# Altium footprint library Ixora.PcbLib: 191 footprints (part 5 of 12)
Each footprint in its own frame and in the unit in brackets; x right, y up, seen from the top. Pads: shape width x height; smd on the part's side, far side on the other; paste and mask are expansions set on the pad; w line width, h text height; cw(c..) or ccw(c..) is an arc to the next point about the centre after c.
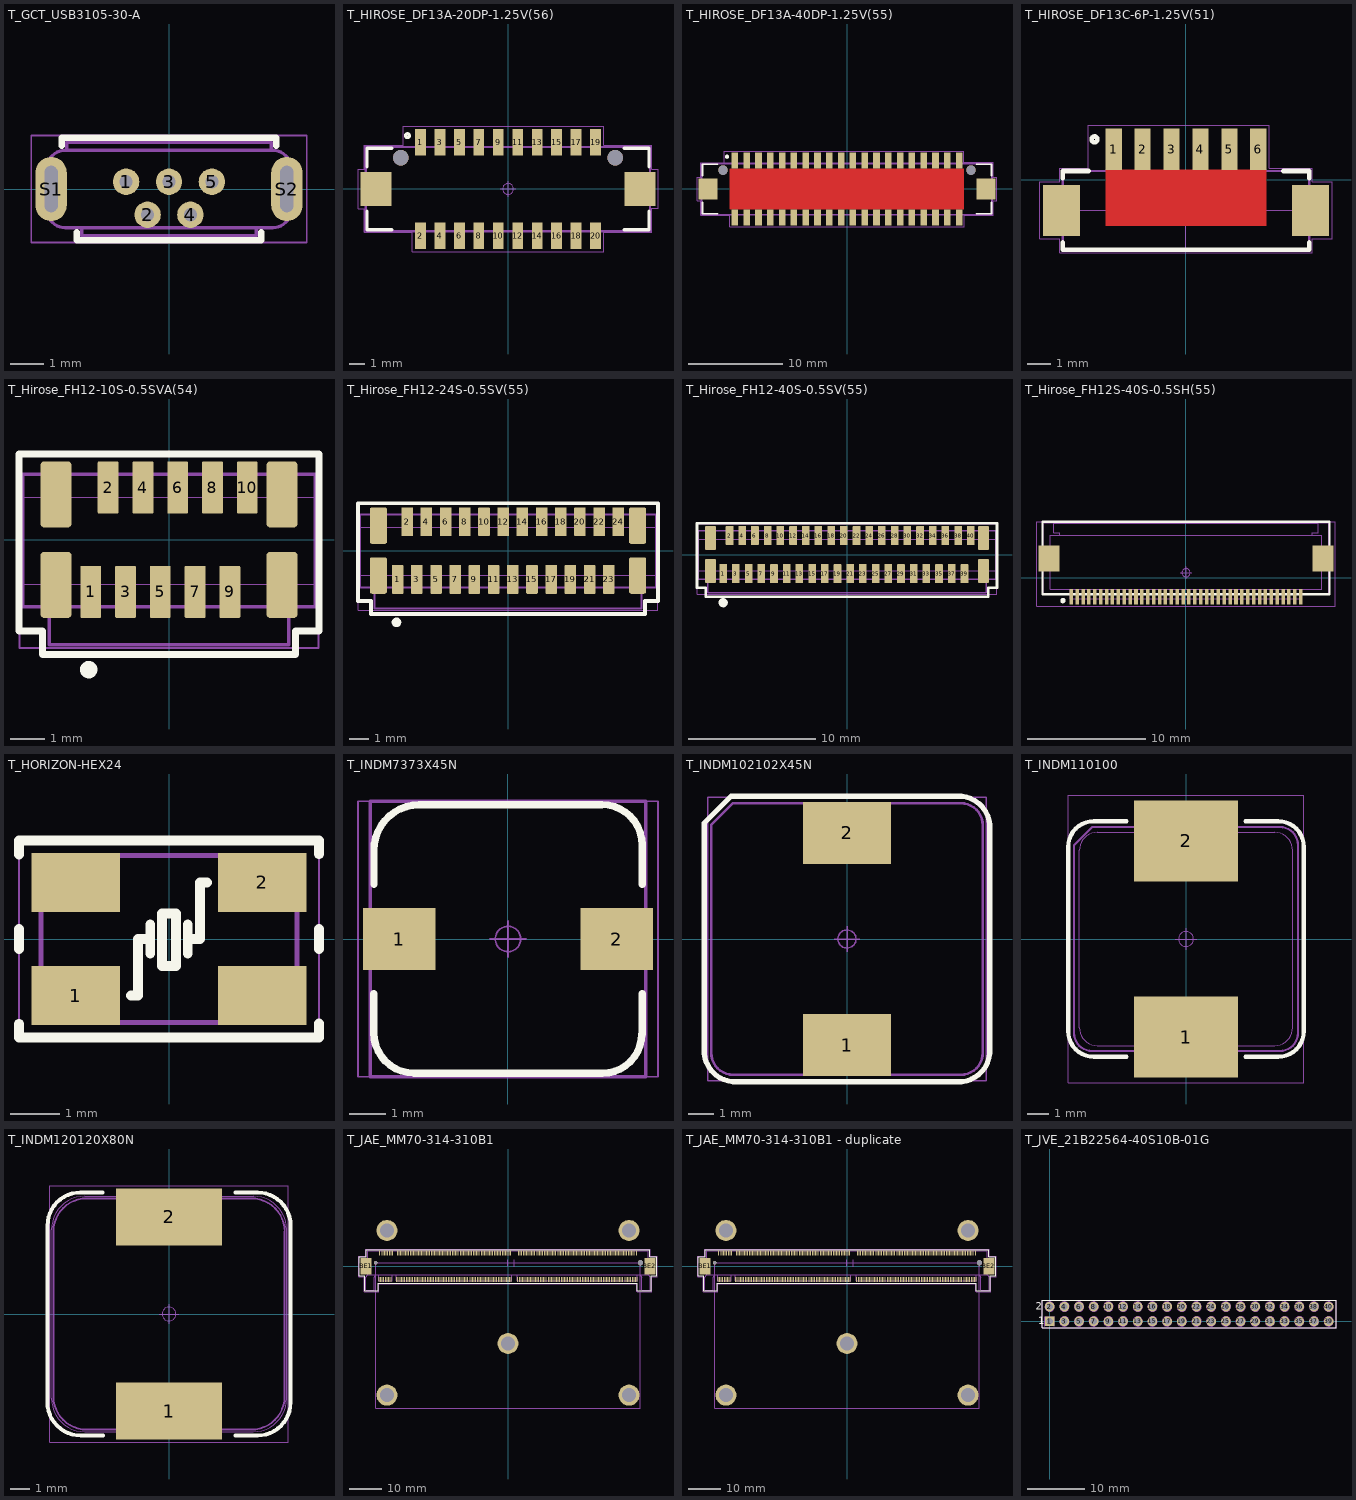
[diagram p4: the footprints below, top view; thin cyan lines are the x and y axes]

## T_GCT_USB3105-30-A [mm] "Micro USB Connector Vertical"
height 5.6
pads (7):
  round 0.8 hole 0.4: 1(-1.3,0.22) 2(-0.65,-0.78) 3(0,0.22) 4(0.65,-0.78) 5(1.3,0.22)
  oval 0.95x1.95 hole 0.4 slot 1.4 at 90 deg: S1(-3.575,0) S2(3.575,0)
Top Overlay:
  lines w0.2: -3.25,1.32 -3.25,1.55 3.25,1.55 3.25,1.32 ; -2.8,-1.32 -2.8,-1.55 2.8,-1.55 2.8,-1.32
Mechanical 1:
  lines w0.05: -4.175,-1.625 -4.175,1.625 4.175,1.625 4.175,-1.625 -4.175,-1.625
Mechanical 2:
  lines w0.001: -3.7,-0.175 -3.945,-0.175 -3.945,0.625 -3.7,0.625 ; -3.1,1.175 -3.1,1.42 3.1,1.42 3.1,1.175 ; -2.65,-1.175 -2.65,-1.42 2.65,-1.42 2.65,-1.175 ; 3.15,1.175 cw(c3.15,0.625) 3.7,0.625 ; 3.175,1.175 -3.15,1.175 ccw(c-3.15,0.625) -3.7,0.625 ; 3.7,-0.175 3.945,-0.175 3.945,0.625 3.7,0.625 ; -3.7,0.625 -3.7,-0.625 ccw(c-3.15,-0.625) -3.15,-1.175 3.15,-1.175 ccw(c3.15,-0.625) 3.7,-0.625 3.7,0.625
Mechanical 3:
  lines w0.1: -3.7,-0.175 -3.945,-0.175 -3.945,0.625 -3.7,0.625 ; -3.1,1.175 -3.1,1.42 3.1,1.42 3.1,1.175 ; -2.65,-1.175 -2.65,-1.42 2.65,-1.42 2.65,-1.175 ; 3.15,1.175 cw(c3.15,0.625) 3.7,0.625 ; 3.175,1.175 -3.15,1.175 ccw(c-3.15,0.625) -3.7,0.625 ; 3.7,-0.175 3.945,-0.175 3.945,0.625 3.7,0.625 ; -3.7,0.625 -3.7,-0.625 ccw(c-3.15,-0.625) -3.15,-1.175 3.15,-1.175 ccw(c3.15,-0.625) 3.7,-0.625 3.7,0.625
3D body: height 5.62, standoff -1.48, extent -3.98,-1.455 3.98,1.48

## T_HIROSE_DF13A-20DP-1.25V(56) [mm]
height 4.8
pads (24):
  rect 0.7x1.7 smd: 1(-5.625,3) 2(-5.625,-3) 3(-4.375,3) 4(-4.375,-3) 5(-3.125,3) 6(-3.125,-3) 7(-1.875,3) 8(-1.875,-3) 9(-0.625,3) 10(-0.625,-3) 11(0.625,3) 12(0.625,-3) 13(1.875,3) 14(1.875,-3) 15(3.125,3) 16(3.125,-3) 17(4.375,3) 18(4.375,-3) 19(5.625,3) 20(5.625,-3)
  rect 2x2.2 smd: ""(-8.475,0) ""(8.475,0)
  round 1 hole 1 unplated paste+0 mask+0: ""(-6.875,2) ""(6.875,2)
Top Overlay:
  circle w0.2: c-6.455,3.42 r0.125
  lines w0.2: -9.04,-1.42 -9.04,-2.62 -7.463,-2.62 ; -9.04,1.41 -9.04,2.61 -7.463,2.61 ; 7.463,-2.62 9.04,-2.62 9.04,-1.42 ; 7.463,2.61 9.04,2.61 9.04,1.41
Mechanical 1:
  circle w0.05: c0,0 r0.35
  lines w0.05: -0.5,0 0.5,0 ; 0,-0.5 0,0.5 ; 9.222,1.255 9.222,2.804 8.052,2.804 6.136,2.804 6.136,4.01 -6.726,4.01 -6.726,2.796 -9.216,2.796 -9.216,1.652 -9.216,1.252 -9.63,1.252 -9.63,-1.258 -9.218,-1.258 -9.218,-2.796 -6.142,-2.796 -6.142,-4.02 6.143,-4.02 6.143,-2.796 9.221,-2.796 9.221,-1.248 9.63,-1.248 ; 9.224,1.255 9.63,1.255 9.63,-1.237
Mechanical 2:
  lines w0.001: -9.175,-2.75 9.175,-2.75 9.175,2.75 -9.175,2.75 -9.175,-2.75
Mechanical 3:
  lines w0.1: -9.1,-2.68 9.1,-2.68 9.1,2.67 -9.1,2.67 -9.1,-2.68
3D body: height 4.8, standoff 0, extent -9.175,-3.45 9.175,3.45

## T_HIROSE_DF13A-40DP-1.25V(55) [mm]
height 4.8
pads (44):
  rect 0.7x1.7 smd: 1(-11.875,3) 2(-11.875,-3) 3(-10.625,3) 4(-10.625,-3) 5(-9.375,3) 6(-9.375,-3) 7(-8.125,3) 8(-8.125,-3) 9(-6.875,3) 10(-6.875,-3) 11(-5.625,3) 12(-5.625,-3) 13(-4.375,3) 14(-4.375,-3) 15(-3.125,3) 16(-3.125,-3) 17(-1.875,3) 18(-1.875,-3) 19(-0.625,3) 20(-0.625,-3) 21(0.625,3) 22(0.625,-3) 23(1.875,3) 24(1.875,-3) 25(3.125,3) 26(3.125,-3) 27(4.375,3) 28(4.375,-3) 29(5.625,3) 30(5.625,-3) 31(6.875,3) 32(6.875,-3) 33(8.125,3) 34(8.125,-3) 35(9.375,3) 36(9.375,-3) 37(10.625,3) 38(10.625,-3) 39(11.875,3) 40(11.875,-3)
  rect 2x2.2 smd: ""(-14.725,0) ""(14.725,0)
  round 1 hole 1 unplated paste+0 mask+0: ""(-13.125,2) ""(13.125,2)
Top Layer:
  pour cut-out: -12.4,-2.15 12.375,-2.15 12.375,2.15 -12.4,2.15
Top Overlay:
  circle w0.2: c-12.705,3.42 r0.125
  lines w0.2: -15.29,-1.42 -15.29,-2.62 -13.713,-2.62 ; -15.29,1.41 -15.29,2.61 -13.713,2.61 ; 13.713,-2.62 15.29,-2.62 15.29,-1.42 ; 13.713,2.61 15.29,2.61 15.29,1.41
Mechanical 1:
  circle w0.05: c0,0 r0.35
  lines w0.05: -0.5,0 0.5,0 ; 0,-0.5 0,0.5 ; 15.472,1.255 15.472,2.804 14.302,2.804 12.386,2.804 12.386,4.01 -12.976,4.01 -12.976,2.796 -15.466,2.796 -15.466,1.652 -15.466,1.252 -15.88,1.252 -15.88,-1.258 -15.468,-1.258 -15.468,-2.796 -12.392,-2.796 -12.392,-4.02 12.393,-4.02 12.393,-2.796 15.471,-2.796 15.471,-1.248 15.88,-1.248 ; 15.474,1.255 15.88,1.255 15.88,-1.237
Mechanical 2:
  lines w0.001: -15.425,-2.75 15.425,-2.75 15.425,2.75 -15.425,2.75 -15.425,-2.75
Mechanical 3:
  lines w0.1: -15.35,-2.68 15.35,-2.68 15.35,2.67 -15.35,2.67 -15.35,-2.68
3D body: height 4.82, standoff 0.02, extent -15.425,-3.45 15.425,3.45

## T_HIROSE_DF13C-6P-1.25V(51) [mm] "Touch connector"
height 4.8
pads (8):
  rect 0.7x1.8 smd: 1(-3.125,1.325) 2(-1.875,1.325) 3(-0.625,1.325) 4(0.625,1.325) 5(1.875,1.325) 6(3.125,1.325)
  rect 1.6x2.2 smd: ""(-5.385,-1.324) ""(5.385,-1.324)
Top Layer:
  pour cut-out: -3.475,0.425 -3.475,-1.994 3.475,-1.994 3.475,0.425
Top Overlay:
  circle w0.2: c-3.955,1.745 r0.125
  lines w0.2: -5.325,-2.713 -5.325,-3.024 5.325,-3.024 5.325,-2.713 ; -5.325,0.064 -5.325,0.376 -4.201,0.376 ; 4.201,0.376 5.325,0.376 5.325,0.064
Mechanical 1:
  lines w0.05: -6.316,-2.555 -6.316,-0.093 -5.456,-0.093 -5.456,0.506 -4.226,0.506 -4.226,2.354 3.606,2.354 3.606,0.507 5.456,0.507 5.456,-0.092 6.316,-0.093 6.316,-2.555 5.456,-2.555 5.456,-3.155 -5.456,-3.155 -5.456,-2.555 -6.316,-2.555
Mechanical 2:
  region: -5.991,-1.074 -5.45,-1.074 -5.45,-1.575 -5.991,-1.575
  lines w0.001: -5.325,-2.224 -6.075,-2.224 -6.075,-0.424 -5.325,-0.424 ; -5.325,-1.324 5.325,-1.324 ; 0,-3.024 0,0.376 ; 5.325,-2.224 6.075,-2.224 6.075,-0.424 5.325,-0.424 ; -5.325,-3.024 -5.325,0.376 5.325,0.376 5.325,-3.024 -5.325,-3.024
Mechanical 3:
  lines w0.1: -5.325,-3.024 -5.325,0.376 5.325,0.376 5.325,-3.024 -5.325,-3.024
3D body: height 4.82, standoff 0.02, extent -6.075,-3.025 6.075,1.875

## T_Hirose_FH12-10S-0.5SVA(54) [mm] "FFC Connector 0.5mm pitch Vertical, 10 pin"
height 5.5
pads (14):
  rrect12% 0.6x1.5 smd: 1(-2.25,-1.5) 2(-1.75,1.5) 3(-1.25,-1.5) 4(-0.75,1.5) 5(-0.25,-1.5) 6(0.25,1.5) 7(0.75,-1.5) 8(1.25,1.5) 9(1.75,-1.5) 10(2.25,1.5)
  rrect25% 0.9x1.9 smd: ""(-3.25,-1.3) ""(-3.25,1.3) ""(3.25,-1.3) ""(3.25,1.3)
Top Overlay:
  circle w0.25: c-2.31,-3.738 r0.125
  lines w0.2: -4.314,-2.625 -3.632,-2.625 -3.632,-3.307 3.632,-3.307 3.632,-2.625 4.314,-2.625 4.314,2.464 -4.314,2.464 -4.314,-2.625
Mechanical 1:
  lines w0.05: -4.3,-3.116 -4.3,2.416 4.3,2.416 4.3,-3.116 -4.3,-3.116
Mechanical 2:
  lines w0.001: -4.2,-1.275 4.2,-1.275 ; -4.2,1.225 4.2,1.225 ; -3.45,-1.925 -3.45,-3.025 3.45,-3.025 3.45,-1.925 ; -4.2,-1.925 -4.2,1.875 4.2,1.875 4.2,-1.925 -4.2,-1.925
Mechanical 3:
  lines w0.1: -3.45,-1.925 -3.45,-3.025 3.45,-3.025 3.45,-1.925 ; -4.2,-1.925 -4.2,1.875 4.2,1.875 4.2,-1.925 -4.2,-1.925
3D body: height 4.85, standoff -0.65, extent -4.2,-1.925 4.2,1.875

## T_Hirose_FH12-24S-0.5SV(55) [mm] "FFC Connector 0.5mm pitch Vertical"
height 5.5
pads (28):
  rrect12% 0.6x1.5 smd: 1(-5.75,-1.5) 2(-5.25,1.5) 3(-4.75,-1.5) 4(-4.25,1.5) 5(-3.75,-1.5) 6(-3.25,1.5) 7(-2.75,-1.5) 8(-2.25,1.5) 9(-1.75,-1.5) 10(-1.25,1.5) 11(-0.75,-1.5) 12(-0.25,1.5) 13(0.25,-1.5) 14(0.75,1.5) 15(1.25,-1.5) 16(1.75,1.5) 17(2.25,-1.5) 18(2.75,1.5) 19(3.25,-1.5) 20(3.75,1.5) 21(4.25,-1.5) 22(4.75,1.5) 23(5.25,-1.5) 24(5.75,1.5)
  rrect25% 0.9x1.9 smd: ""(-6.75,-1.3) ""(-6.75,1.3) ""(6.75,-1.3) ""(6.75,1.3)
Top Overlay:
  circle w0.25: c-5.81,-3.738 r0.125
  lines w0.2: -7.814,-2.625 -7.814,2.464 7.814,2.464 7.814,-2.625 7.132,-2.625 7.132,-3.307 -7.132,-3.307 -7.132,-2.625 -7.814,-2.625
Mechanical 1:
  lines w0.05: -7.8,-3.116 7.8,-3.116 7.8,2.416 -7.8,2.416 -7.8,-3.116
Mechanical 2:
  lines w0.001: -7.7,-1.275 7.7,-1.275 ; -7.7,1.225 7.7,1.225 ; -6.95,-1.925 -6.95,-3.025 6.95,-3.025 6.95,-1.925 ; -7.7,-1.925 7.7,-1.925 7.7,1.875 -7.7,1.875 -7.7,-1.925
Mechanical 3:
  lines w0.1: -6.95,-1.925 -6.95,-3.025 6.95,-3.025 6.95,-1.925 ; -7.7,-1.925 7.7,-1.925 7.7,1.875 -7.7,1.875 -7.7,-1.925
3D body: height 5.52, standoff 0.02, extent -7.7,-1.925 7.7,1.875

## T_Hirose_FH12-40S-0.5SV(55) [mm] "FFC Connector 0.5mm pitch Vertical"
height 5.5
pads (44):
  rrect12% 0.6x1.5 smd: 1(-9.75,-1.5) 2(-9.25,1.5) 3(-8.75,-1.5) 4(-8.25,1.5) 5(-7.75,-1.5) 6(-7.25,1.5) 7(-6.75,-1.5) 8(-6.25,1.5) 9(-5.75,-1.5) 10(-5.25,1.5) 11(-4.75,-1.5) 12(-4.25,1.5) 13(-3.75,-1.5) 14(-3.25,1.5) 15(-2.75,-1.5) 16(-2.25,1.5) 17(-1.75,-1.5) 18(-1.25,1.5) 19(-0.75,-1.5) 20(-0.25,1.5) 21(0.25,-1.5) 22(0.75,1.5) 23(1.25,-1.5) 24(1.75,1.5) 25(2.25,-1.5) 26(2.75,1.5) 27(3.25,-1.5) 28(3.75,1.5) 29(4.25,-1.5) 30(4.75,1.5) 31(5.25,-1.5) 32(5.75,1.5) 33(6.25,-1.5) 34(6.75,1.5) 35(7.25,-1.5) 36(7.75,1.5) 37(8.25,-1.5) 38(8.75,1.5) 39(9.25,-1.5) 40(9.75,1.5)
  rrect25% 0.9x1.9 smd: ""(-10.75,-1.3) ""(-10.75,1.3) ""(10.75,-1.3) ""(10.75,1.3)
Top Overlay:
  circle w0.4: c-9.75,-3.79 r0.16
  lines w0.2: 11.13,-3.307 -11.132,-3.307 -11.132,-2.625 -11.814,-2.625 -11.814,2.464 11.814,2.464 11.814,-2.625 11.132,-2.625 11.132,-3.307
Mechanical 1:
  lines w0.05: -11.8,-3.116 11.8,-3.116 11.8,2.416 -11.8,2.416 -11.8,-3.116
Mechanical 2:
  lines w0.001: -11.7,-1.275 11.7,-1.275 ; -11.7,1.225 11.7,1.225 ; -10.95,-1.925 -10.95,-3.025 10.95,-3.025 10.95,-1.925 ; -11.7,-1.925 11.7,-1.925 11.7,1.875 -11.7,1.875 -11.7,-1.925
Mechanical 3:
  lines w0.1: -10.95,-1.925 -10.95,-3.025 10.95,-3.025 10.95,-1.925 ; -11.7,-1.925 11.7,-1.925 11.7,1.875 -11.7,1.875 -11.7,-1.925
3D body: height 5.52, standoff 0.02, extent -11.7,-1.925 11.7,1.875

## T_Hirose_FH12S-40S-0.5SH(55) [mm] "DVI FFC Connector 0.5mm pitch"
height 2
pads (42):
  rect 0.3x1.3 smd: 1(-9.75,-1.625) 2(-9.25,-1.625) 3(-8.75,-1.625) 4(-8.25,-1.625) 5(-7.75,-1.625) 6(-7.25,-1.625) 7(-6.75,-1.625) 8(-6.25,-1.625) 9(-5.75,-1.625) 10(-5.25,-1.625) 11(-4.75,-1.625) 12(-4.25,-1.625) 13(-3.75,-1.625) 14(-3.25,-1.625) 15(-2.75,-1.625) 16(-2.25,-1.625) 17(-1.75,-1.625) 18(-1.25,-1.625) 19(-0.75,-1.625) 20(-0.25,-1.625) 21(0.25,-1.625) 22(0.75,-1.625) 23(1.25,-1.625) 24(1.75,-1.625) 25(2.25,-1.625) 26(2.75,-1.625) 27(3.25,-1.625) 28(3.75,-1.625) 29(4.25,-1.625) 30(4.75,-1.625) 31(5.25,-1.625) 32(5.75,-1.625) 33(6.25,-1.625) 34(6.75,-1.625) 35(7.25,-1.625) 36(7.75,-1.625) 37(8.25,-1.625) 38(8.75,-1.625) 39(9.25,-1.625) 40(9.75,-1.625)
  rect 1.8x2.2 smd: ""(-11.65,1.625) ""(11.65,1.625)
Top Overlay:
  circle w0.2: c-10.459,-1.944 r0.125
  lines w0.2: -12.198,-1.411 12.193,-1.411 12.193,4.755 -12.198,4.755 -12.198,-1.411
Mechanical 1:
  circle w0.05: c0,0.425 r0.35
  lines w0.05: -0.5,0.425 0.5,0.425 ; 0,-0.075 0,0.925 ; -12.69,-2.415 12.69,-2.415 12.69,4.755 -12.69,4.755 -12.69,-2.415
Mechanical 2:
  lines w0.001: -10.75,3.625 -10.75,3.825 -11.25,3.825 -11.25,4.625 11.25,4.625 11.25,3.825 10.75,3.825 10.75,3.625 ; -9.85,-0.975 -9.85,-1.775 9.85,-1.775 9.85,-0.975 ; -12.05,1.025 -11.55,1.025 -11.55,-0.975 11.55,-0.975 11.55,1.025 12.05,1.025 12.05,2.225 11.55,2.225 11.55,3.625 -11.55,3.625 -11.55,2.225 -12.05,2.225 -12.05,1.025
Mechanical 3:
  lines w0.1: -12.125,-1.336 12.12,-1.336 12.12,4.689 -12.125,4.689 -12.125,-1.336

## T_HORIZON-HEX24 [mm] "OSC"
height 0.9
pads (4):
  rect 1.8x1.2 smd: 1(-1.9,-1.15) 2(1.9,1.15) ""(-1.9,1.15) ""(1.9,-1.15)
Top Overlay:
  lines w0.2: -3.05,-1.722 -3.05,-2.001 3.05,-2.001 ; -3.05,-0.2 -3.05,0.2 ; -3.05,1.72 -3.05,1.999 ; -3.05,2.001 3.05,2.001 3.05,1.722 ; -0.77,-1.15 -0.63,-1.15 -0.63,0 -0.38,0 ; -0.38,-0.3 -0.38,0.3 ; 0.38,-0.3 0.38,0.3 ; 0.38,0 0.63,0 0.63,1.15 0.77,1.15 ; 3.05,-1.999 3.05,-1.72 ; 3.05,-0.2 3.05,0.2 ; -0.14,-0.55 0.14,-0.55 0.14,0.52 -0.14,0.52 -0.14,-0.55
Mechanical 1:
  lines w0.05: -3.05,-2.001 -3.05,2.001 3.05,2.001 3.05,-2.001 -3.05,-2.001
Mechanical 2:
  lines w0.001: -2.6,-1.7 -2.6,1.7 2.6,1.7 2.6,-1.7 -2.6,-1.7
Mechanical 3:
  lines w0.1: -2.6,-1.7 -2.6,1.7 2.6,1.7 2.6,-1.7 -2.6,-1.7
3D body: height 0.9, standoff 0, extent -2.6,-1.7 2.6,1.7

## T_INDM7373X45N [mm]
height 4.5
pads (2):
  rect 2x1.7 smd: 1(-3,0) 2(3,0)
Top Overlay:
  lines w0.2: -3.7,-1.5 -3.7,-2.59 ccw(c-2.594,-2.59) -2.594,-3.697 ; -3.696,1.5 -3.696,2.6 ; -3.696,2.452 cw(c-2.448,2.452) -2.448,3.7 2.588,3.7 ; -2.594,-3.7 2.609,-3.7 ccw(c2.609,-2.623) 3.686,-2.623 ; 2.588,3.708 cw(c2.588,2.596) 3.7,2.596 ; 3.7,-2.623 3.7,-1.5 ; 3.7,1.5 3.7,2.6
Mechanical 1:
  circle w0.05: c0,0 r0.35
  lines w0.05: -0.5,0 0.5,0 ; 0,-0.5 0,0.5 ; -4.135,-3.8 4.136,-3.8 4.136,3.8 -4.135,3.8 -4.135,-3.8
Mechanical 2:
  lines w0.001: -3.8,-3.8 3.8,-3.8 3.8,3.8 -3.8,3.8 -3.8,-3.8
Mechanical 3:
  lines w0.1: -3.8,-3.8 3.8,-3.8 3.8,3.8 -3.8,3.8 -3.8,-3.8
3D body: height 4.12, standoff 0.02, extent -3.65,-3.65 3.65,3.65

## T_INDM102102X45N [mm]
height 4.5
pads (2):
  rect 3.4x2.4 smd: 1(0,-4.1) 2(0,4.1)
Top Overlay:
  lines w0.2: 4.24,-5.52 ccw(c4.32,-4.32) 5.52,-4.4 5.52,4.4 ; 4.4,-5.52 -4.4,-5.52 cw(c-4.32,-4.32) -5.52,-4.24 -5.52,4.49 -4.49,5.52 4.24,5.52 cw(c4.32,4.32) 5.52,4.24
Mechanical 1:
  circle w0.05: c0,0 r0.35
  lines w0.05: -0.5,0 0.5,0 ; 0,-0.5 0,0.5 ; -5.38,-5.48 -5.38,5.48 5.38,5.48 5.38,-5.48 -5.38,-5.48
Mechanical 2:
  lines w0.001: -5.25,-4.4 ccw(c-4.4,-4.4) -4.4,-5.25 4.4,-5.25 ccw(c4.4,-4.4) 5.25,-4.4 5.25,4.4 ccw(c4.4,4.4) 4.4,5.25 -4.4,5.25 -5.25,4.4 -5.25,-4.4
Mechanical 3:
  lines w0.1: -5.25,-4.4 ccw(c-4.4,-4.4) -4.4,-5.25 4.4,-5.25 ccw(c4.4,-4.4) 5.25,-4.4 5.25,4.4 ccw(c4.4,4.4) 4.4,5.25 -4.4,5.25 -5.25,4.4 -5.25,-4.4
3D body: height 4.5, standoff 0, extent -5.25,-5.25 5.25,5.25

## T_INDM110100 [mm] "Inductor shielded, 11mm x 10mm (Bourns, SRP1038A; Vishay, IHLP4040DZ-8A)"
height 4
pads (2):
  rect 4.86x3.8 smd: 1(0,-4.6) 2(0,4.6)
Top Overlay:
  lines w0.2: -2.794,-5.523 -4.32,-5.523 cw(c-4.32,-4.32) -5.523,-4.32 -5.523,4.32 cw(c-4.32,4.32) -4.32,5.523 -2.794,5.523 ; 2.794,-5.523 4.32,-5.523 ccw(c4.32,-4.32) 5.523,-4.32 5.523,4.343 ; 2.794,5.523 4.32,5.523 cw(c4.32,4.32) 5.523,4.32
Mechanical 1:
  circle w0.05: c0,0 r0.35
  lines w0.05: -0.5,0 0.5,0 ; 0,-0.5 0,0.5 ; -5.52,-6.731 -5.52,6.731 5.52,6.731 5.52,-6.731 -5.52,-6.731
Mechanical 2:
  lines w0.001: -5,-4.15 ccw(c-4.15,-4.15) -4.15,-5 4.15,-5 ccw(c4.15,-4.15) 5,-4.15 5,4.15 ccw(c4.15,4.15) 4.15,5 -4.15,5 ccw(c-4.15,4.15) -5,4.15 -5,-4.15 ; -1.5,-5.5 -1.5,-3.2 1.5,-3.2 1.5,-5.5 -1.5,-5.5
Mechanical 3:
  lines w0.1: -5.25,-4.4 ccw(c-4.4,-4.4) -4.4,-5.25 4.4,-5.25 ccw(c4.4,-4.4) 5.25,-4.4 5.25,4.4 ccw(c4.4,4.4) 4.4,5.25 -4.4,5.25 -5.25,4.4 -5.25,-4.4
3D body: height 3.75, standoff 0, extent -5.004,-5.2 4.996,5.2

## T_INDM120120X80N [mm]
height 6
pads (2):
  rect 5.4x2.9 smd: 1(0,-4.95) 2(0,4.95)
Top Overlay:
  lines w0.2: -6.204,-4.492 ccw(c-4.496,-4.492) -4.496,-6.2 -3.373,-6.2 ; -6.2,-4.492 -6.2,4.516 ; -6.196,4.516 cw(c-4.513,4.516) -4.513,6.2 -3.39,6.2 ; 3.382,-6.2 4.505,-6.2 ccw(c4.505,-4.509) 6.196,-4.509 ; 3.393,6.196 4.516,6.196 cw(c4.516,4.512) 6.2,4.512 6.2,-4.509
Mechanical 1:
  circle w0.05: c0,0 r0.35
  lines w0.05: -0.5,0 0.5,0 ; 0,-0.5 0,0.5 ; -6.08,-6.535 6.08,-6.535 6.08,6.535 -6.08,6.535 -6.08,-6.535
Mechanical 2:
  lines w0.001: -6,-4.299 ccw(c-4.299,-4.299) -4.3,-6 ; -6,4.3 cw(c-4.299,4.299) -4.299,6 ; -6,-4.302 -6,4.303 ; -4.303,6 4.322,6 ; -4.302,-6 4.304,-6 ; 4.299,-6 ccw(c4.299,-4.299) 6,-4.3 ; 4.3,6 cw(c4.299,4.299) 6,4.299 ; 6,-4.313 6,4.322
Mechanical 3:
  lines w0.1: -5.901,-4.198 ccw(c-4.2,-4.198) -4.201,-5.899 ; -5.9,-4.21 -5.9,4.2 ; -5.899,4.201 cw(c-4.198,4.2) -4.198,5.901 ; -4.21,-5.9 4.21,-5.9 ; -4.2,5.9 4.2,5.9 ; 4.198,-5.901 ccw(c4.198,-4.2) 5.899,-4.201 ; 4.201,5.899 cw(c4.2,4.198) 5.901,4.198 ; 5.9,-4.21 5.9,4.2
3D body: height 6, standoff 0, extent -6,-6 6,6

## T_JAE_MM70-314-310B1 [mm] "MXM 3.0 Connector"
height 6.7
pads (319):
  rect 0.3x1.5 smd: 1(-40,-4.1) 2(-39.75,4.1) 3(-39.5,-4.1) 4(-39.25,4.1) 5(-39,-4.1) 6(-38.75,4.1) 7(-38.5,-4.1) 8(-38.25,4.1) 9(-38,-4.1) 10(-37.75,4.1) 11(-37.5,-4.1) 12(-37.25,4.1) 13(-37,-4.1) 14(-36.75,4.1) 15(-36.5,-4.1) 16(-36.25,4.1) 17(-36,-4.1) 18(-35.75,4.1) 23(-34.5,-4.1) 24(-34.25,4.1) 25(-34,-4.1) 26(-33.75,4.1) 27(-33.5,-4.1) 28(-33.25,4.1) 29(-33,-4.1) 30(-32.75,4.1) 31(-32.5,-4.1) 32(-32.25,4.1) 33(-32,-4.1) 34(-31.75,4.1) 35(-31.5,-4.1) 36(-31.25,4.1) 37(-31,-4.1) 38(-30.75,4.1) 39(-30.5,-4.1) 40(-30.25,4.1) 41(-30,-4.1) 42(-29.75,4.1) 43(-29.5,-4.1) 44(-29.25,4.1) 45(-29,-4.1) 46(-28.75,4.1) 47(-28.5,-4.1) 48(-28.25,4.1) 49(-28,-4.1) 50(-27.75,4.1) 51(-27.5,-4.1) 52(-27.25,4.1) 53(-27,-4.1) 54(-26.75,4.1) 55(-26.5,-4.1) 56(-26.25,4.1) 57(-26,-4.1) 58(-25.75,4.1) 59(-25.5,-4.1) 60(-25.25,4.1) 61(-25,-4.1) 62(-24.75,4.1) 63(-24.5,-4.1) 64(-24.25,4.1) 65(-24,-4.1) 66(-23.75,4.1) 67(-23.5,-4.1) 68(-23.25,4.1) 69(-23,-4.1) 70(-22.75,4.1) 71(-22.5,-4.1) 72(-22.25,4.1) 73(-22,-4.1) 74(-21.75,4.1) 75(-21.5,-4.1) 76(-21.25,4.1) 77(-21,-4.1) 78(-20.75,4.1) 79(-20.5,-4.1) 80(-20.25,4.1) 81(-20,-4.1) 82(-19.75,4.1) 83(-19.5,-4.1) 84(-19.25,4.1) 85(-19,-4.1) 86(-18.75,4.1) 87(-18.5,-4.1) 88(-18.25,4.1) 89(-18,-4.1) 90(-17.75,4.1) 91(-17.5,-4.1) 92(-17.25,4.1) 93(-17,-4.1) 94(-16.75,4.1) 95(-16.5,-4.1) 96(-16.25,4.1) 97(-16,-4.1) 98(-15.75,4.1) 99(-15.5,-4.1) 100(-15.25,4.1) 101(-15,-4.1) 102(-14.75,4.1) 103(-14.5,-4.1) 104(-14.25,4.1) 105(-14,-4.1) 106(-13.75,4.1) 107(-13.5,-4.1) 108(-13.25,4.1) 109(-13,-4.1) 110(-12.75,4.1) 111(-12.5,-4.1) 112(-12.25,4.1) 113(-12,-4.1) 114(-11.75,4.1) 115(-11.5,-4.1) 116(-11.25,4.1) 117(-11,-4.1) 118(-10.75,4.1) 119(-10.5,-4.1) 120(-10.25,4.1) 121(-10,-4.1) 122(-9.75,4.1) 123(-9.5,-4.1) 124(-9.25,4.1) 125(-9,-4.1) 126(-8.75,4.1) 127(-8.5,-4.1) 128(-8.25,4.1) 129(-8,-4.1) 130(-7.75,4.1) 131(-7.5,-4.1) 132(-7.25,4.1) 133(-7,-4.1) 134(-6.75,4.1) 135(-6.5,-4.1) 136(-6.25,4.1) 137(-6,-4.1) 138(-5.75,4.1) 139(-5.5,-4.1) 140(-5.25,4.1) 141(-5,-4.1) 142(-4.75,4.1) 143(-4.5,-4.1) 144(-4.25,4.1) 145(-4,-4.1) 146(-3.75,4.1) 147(-3.5,-4.1) 148(-3.25,4.1) 149(-3,-4.1) 150(-2.75,4.1) 151(-2.5,-4.1) 152(-2.25,4.1) 153(-2,-4.1) 154(-1.75,4.1) 155(-1.5,-4.1) 156(-1.25,4.1) 157(-1,-4.1) 158(-0.75,4.1) 159(-0.5,-4.1) 160(-0.25,4.1) 161(0,-4.1) 162(0.25,4.1) 163(0.5,-4.1) 164(0.75,4.1) 165(1,-4.1) 173(3,-4.1) 174(3.25,4.1) 175(3.5,-4.1) 176(3.75,4.1) 177(4,-4.1) 178(4.25,4.1) 179(4.5,-4.1) 180(4.75,4.1) 181(5,-4.1) 182(5.25,4.1) 183(5.5,-4.1) 184(5.75,4.1) 185(6,-4.1) 186(6.25,4.1) 187(6.5,-4.1) 188(6.75,4.1) 189(7,-4.1) 190(7.25,4.1) 191(7.5,-4.1) 192(7.75,4.1) 193(8,-4.1) 194(8.25,4.1) 195(8.5,-4.1) 196(8.75,4.1) 197(9,-4.1) 198(9.25,4.1) 199(9.5,-4.1) 200(9.75,4.1) 201(10,-4.1) 202(10.25,4.1) 203(10.5,-4.1) 204(10.75,4.1) 205(11,-4.1) 206(11.25,4.1) 207(11.5,-4.1) 208(11.75,4.1) 209(12,-4.1) 210(12.25,4.1) 211(12.5,-4.1) 212(12.75,4.1) 213(13,-4.1) 214(13.25,4.1) 215(13.5,-4.1) 216(13.75,4.1) 217(14,-4.1) 218(14.25,4.1) 219(14.5,-4.1) 220(14.75,4.1) 221(15,-4.1) 222(15.25,4.1) 223(15.5,-4.1) 224(15.75,4.1) 225(16,-4.1) 226(16.25,4.1) 227(16.5,-4.1) 228(16.75,4.1) 229(17,-4.1) 230(17.25,4.1) 231(17.5,-4.1) 232(17.75,4.1) 233(18,-4.1) 234(18.25,4.1) 235(18.5,-4.1) 236(18.75,4.1) 237(19,-4.1) 238(19.25,4.1) 239(19.5,-4.1) 240(19.75,4.1) 241(20,-4.1) 242(20.25,4.1) 243(20.5,-4.1) 244(20.75,4.1) 245(21,-4.1) 246(21.25,4.1) 247(21.5,-4.1) 248(21.75,4.1) 249(22,-4.1) 250(22.25,4.1) 251(22.5,-4.1) 252(22.75,4.1) 253(23,-4.1) 254(23.25,4.1) 255(23.5,-4.1) 256(23.75,4.1) 257(24,-4.1) 258(24.25,4.1) 259(24.5,-4.1) 260(24.75,4.1) 261(25,-4.1) 262(25.25,4.1) 263(25.5,-4.1) 264(25.75,4.1) 265(26,-4.1) 266(26.25,4.1) 267(26.5,-4.1) 268(26.75,4.1) 269(27,-4.1) 270(27.25,4.1) 271(27.5,-4.1) 272(27.75,4.1) 273(28,-4.1) 274(28.25,4.1) 275(28.5,-4.1) 276(28.75,4.1) 277(29,-4.1) 278(29.25,4.1) 279(29.5,-4.1) 280(29.75,4.1) 281(30,-4.1) 282(30.25,4.1) 283(30.5,-4.1) 284(30.75,4.1) 285(31,-4.1) 286(31.25,4.1) 287(31.5,-4.1) 288(31.75,4.1) 289(32,-4.1) 290(32.25,4.1) 291(32.5,-4.1) 292(32.75,4.1) 293(33,-4.1) 294(33.25,4.1) 295(33.5,-4.1) 296(33.75,4.1) 297(34,-4.1) 298(34.25,4.1) 299(34.5,-4.1) 300(34.75,4.1) 301(35,-4.1) 302(35.25,4.1) 303(35.5,-4.1) 304(35.75,4.1) 305(36,-4.1) 306(36.25,4.1) 307(36.5,-4.1) 308(36.75,4.1) 309(37,-4.1) 310(37.25,4.1) 311(37.5,-4.1) 312(37.75,4.1) 313(38,-4.1) 314(38.25,4.1) 315(38.5,-4.1) 316(38.75,4.1) 317(39,-4.1) 318(39.25,4.1) 319(39.5,-4.1) 320(39.75,4.1) 321(40,-4.1)
  rect 3.3x5 smd: BE1(-43.95,0) BE2(43.95,0)
  round 1.1 hole 1.1 unplated: ""(-41,1.1)
  round 6.5 hole 4.33: ""(-37.5,-39.9) ""(-37.5,11.1) ""(0,-23.9) ""(37.5,-39.9) ""(37.5,11.1)
  round 1.6 hole 1.6 unplated: ""(41,1.1)
Top Overlay:
  lines w0.2: -46.069,-3 -44.33,-3 -44.33,-7.65 -40.12,-7.65 -40.12,-5.29 40.09,-5.29 40.09,-7.65 44.33,-7.65 44.33,-3 46.069,-3 46.069,3 43.87,3 43.87,5.17 -43.82,5.17 -43.82,3 -46.069,3 -46.069,-3
Mechanical 1:
  lines w0.05: 39.92,-7.82 39.92,-5.46 -39.95,-5.46 -39.95,-7.82 -44.5,-7.82 -44.5,-3.17 -46.24,-3.17 -46.24,3.17 -43.99,3.17 -43.99,5.34 44.04,5.34 44.04,3.16 46.24,3.16 46.24,-3.17 44.5,-3.17 44.5,-7.82 39.95,-7.82
Mechanical 2:
  lines w0.001: -40.9,-2.65 -41.4,-3.35 -41.4,-7.35 -44,-7.35 -44,-3.35 -43.5,-2.65 ; -40.1,-2.65 -40.1,-4.45 -35.9,-4.45 -35.9,-2.65 ; -34.6,-2.65 -34.6,-4.45 1.1,-4.45 1.1,-2.65 ; 0,0 0,2 ; 2,0 2,2 ; 2.9,-2.65 2.9,-4.45 40.1,-4.45 40.1,-2.65 ; 40.9,-2.65 41.4,-3.35 41.4,-7.35 44,-7.35 44,-3.35 43.5,-2.65 ; -43.5,-2.65 43.5,-2.65 ; -43.5,-2.65 -43.5,-2 -44.95,-2 -44.95,2 -43.5,2 -43.5,4.85 43.5,4.85 43.5,2 44.95,2 44.95,-2 43.5,-2 43.5,-2.65 ; -41,-43.9 41,-43.9 41,1.1 -41,1.1 -41,-43.9
Mechanical 3:
  lines w0.1: -40.9,-2.65 -41.4,-3.35 -41.4,-7.35 -44,-7.35 -44,-3.35 -43.5,-2.65 ; -40.1,-2.65 -40.1,-4.45 -35.9,-4.45 -35.9,-2.65 ; -34.6,-2.65 -34.6,-4.45 1.1,-4.45 1.1,-2.65 ; 2.9,-2.65 2.9,-4.45 40.1,-4.45 40.1,-2.65 ; 40.9,-2.65 41.4,-3.35 41.4,-7.35 44,-7.35 44,-3.35 43.5,-2.65 ; -43.5,-2.65 -43.5,-2 -44.95,-2 -44.95,2 -43.5,2 -43.5,4.85 43.5,4.85 43.5,2 44.95,2 44.95,-2 43.5,-2 43.5,-2.65 ; -43.5,-2.65 43.5,-2.65
3D body: height 8.02, standoff -1.51, extent -40.269,8.326 -34.731,13.874
3D body: height 8.02, standoff -1.51, extent 34.731,8.326 40.269,13.874
3D body: height 3.02, standoff -1.51, extent -2.769,-26.674 2.769,-21.126
3D body: height 3.02, standoff -1.51, extent 34.731,-42.674 40.269,-37.126
3D body: height 3.02, standoff -1.51, extent -40.269,-42.674 -34.731,-37.126
3D body: height 6.72, standoff -0.98, extent -44.95,-7.35 44.95,4.85

## T_JAE_MM70-314-310B1 - duplicate [mm] "MXM 3.0 Connector"
height 6.7
pads (319):
  rect 0.3x1.5 smd: 1(-40,-4.1) 2(-39.75,4.1) 3(-39.5,-4.1) 4(-39.25,4.1) 5(-39,-4.1) 6(-38.75,4.1) 7(-38.5,-4.1) 8(-38.25,4.1) 9(-38,-4.1) 10(-37.75,4.1) 11(-37.5,-4.1) 12(-37.25,4.1) 13(-37,-4.1) 14(-36.75,4.1) 15(-36.5,-4.1) 16(-36.25,4.1) 17(-36,-4.1) 18(-35.75,4.1) 23(-34.5,-4.1) 24(-34.25,4.1) 25(-34,-4.1) 26(-33.75,4.1) 27(-33.5,-4.1) 28(-33.25,4.1) 29(-33,-4.1) 30(-32.75,4.1) 31(-32.5,-4.1) 32(-32.25,4.1) 33(-32,-4.1) 34(-31.75,4.1) 35(-31.5,-4.1) 36(-31.25,4.1) 37(-31,-4.1) 38(-30.75,4.1) 39(-30.5,-4.1) 40(-30.25,4.1) 41(-30,-4.1) 42(-29.75,4.1) 43(-29.5,-4.1) 44(-29.25,4.1) 45(-29,-4.1) 46(-28.75,4.1) 47(-28.5,-4.1) 48(-28.25,4.1) 49(-28,-4.1) 50(-27.75,4.1) 51(-27.5,-4.1) 52(-27.25,4.1) 53(-27,-4.1) 54(-26.75,4.1) 55(-26.5,-4.1) 56(-26.25,4.1) 57(-26,-4.1) 58(-25.75,4.1) 59(-25.5,-4.1) 60(-25.25,4.1) 61(-25,-4.1) 62(-24.75,4.1) 63(-24.5,-4.1) 64(-24.25,4.1) 65(-24,-4.1) 66(-23.75,4.1) 67(-23.5,-4.1) 68(-23.25,4.1) 69(-23,-4.1) 70(-22.75,4.1) 71(-22.5,-4.1) 72(-22.25,4.1) 73(-22,-4.1) 74(-21.75,4.1) 75(-21.5,-4.1) 76(-21.25,4.1) 77(-21,-4.1) 78(-20.75,4.1) 79(-20.5,-4.1) 80(-20.25,4.1) 81(-20,-4.1) 82(-19.75,4.1) 83(-19.5,-4.1) 84(-19.25,4.1) 85(-19,-4.1) 86(-18.75,4.1) 87(-18.5,-4.1) 88(-18.25,4.1) 89(-18,-4.1) 90(-17.75,4.1) 91(-17.5,-4.1) 92(-17.25,4.1) 93(-17,-4.1) 94(-16.75,4.1) 95(-16.5,-4.1) 96(-16.25,4.1) 97(-16,-4.1) 98(-15.75,4.1) 99(-15.5,-4.1) 100(-15.25,4.1) 101(-15,-4.1) 102(-14.75,4.1) 103(-14.5,-4.1) 104(-14.25,4.1) 105(-14,-4.1) 106(-13.75,4.1) 107(-13.5,-4.1) 108(-13.25,4.1) 109(-13,-4.1) 110(-12.75,4.1) 111(-12.5,-4.1) 112(-12.25,4.1) 113(-12,-4.1) 114(-11.75,4.1) 115(-11.5,-4.1) 116(-11.25,4.1) 117(-11,-4.1) 118(-10.75,4.1) 119(-10.5,-4.1) 120(-10.25,4.1) 121(-10,-4.1) 122(-9.75,4.1) 123(-9.5,-4.1) 124(-9.25,4.1) 125(-9,-4.1) 126(-8.75,4.1) 127(-8.5,-4.1) 128(-8.25,4.1) 129(-8,-4.1) 130(-7.75,4.1) 131(-7.5,-4.1) 132(-7.25,4.1) 133(-7,-4.1) 134(-6.75,4.1) 135(-6.5,-4.1) 136(-6.25,4.1) 137(-6,-4.1) 138(-5.75,4.1) 139(-5.5,-4.1) 140(-5.25,4.1) 141(-5,-4.1) 142(-4.75,4.1) 143(-4.5,-4.1) 144(-4.25,4.1) 145(-4,-4.1) 146(-3.75,4.1) 147(-3.5,-4.1) 148(-3.25,4.1) 149(-3,-4.1) 150(-2.75,4.1) 151(-2.5,-4.1) 152(-2.25,4.1) 153(-2,-4.1) 154(-1.75,4.1) 155(-1.5,-4.1) 156(-1.25,4.1) 157(-1,-4.1) 158(-0.75,4.1) 159(-0.5,-4.1) 160(-0.25,4.1) 161(0,-4.1) 162(0.25,4.1) 163(0.5,-4.1) 164(0.75,4.1) 165(1,-4.1) 173(3,-4.1) 174(3.25,4.1) 175(3.5,-4.1) 176(3.75,4.1) 177(4,-4.1) 178(4.25,4.1) 179(4.5,-4.1) 180(4.75,4.1) 181(5,-4.1) 182(5.25,4.1) 183(5.5,-4.1) 184(5.75,4.1) 185(6,-4.1) 186(6.25,4.1) 187(6.5,-4.1) 188(6.75,4.1) 189(7,-4.1) 190(7.25,4.1) 191(7.5,-4.1) 192(7.75,4.1) 193(8,-4.1) 194(8.25,4.1) 195(8.5,-4.1) 196(8.75,4.1) 197(9,-4.1) 198(9.25,4.1) 199(9.5,-4.1) 200(9.75,4.1) 201(10,-4.1) 202(10.25,4.1) 203(10.5,-4.1) 204(10.75,4.1) 205(11,-4.1) 206(11.25,4.1) 207(11.5,-4.1) 208(11.75,4.1) 209(12,-4.1) 210(12.25,4.1) 211(12.5,-4.1) 212(12.75,4.1) 213(13,-4.1) 214(13.25,4.1) 215(13.5,-4.1) 216(13.75,4.1) 217(14,-4.1) 218(14.25,4.1) 219(14.5,-4.1) 220(14.75,4.1) 221(15,-4.1) 222(15.25,4.1) 223(15.5,-4.1) 224(15.75,4.1) 225(16,-4.1) 226(16.25,4.1) 227(16.5,-4.1) 228(16.75,4.1) 229(17,-4.1) 230(17.25,4.1) 231(17.5,-4.1) 232(17.75,4.1) 233(18,-4.1) 234(18.25,4.1) 235(18.5,-4.1) 236(18.75,4.1) 237(19,-4.1) 238(19.25,4.1) 239(19.5,-4.1) 240(19.75,4.1) 241(20,-4.1) 242(20.25,4.1) 243(20.5,-4.1) 244(20.75,4.1) 245(21,-4.1) 246(21.25,4.1) 247(21.5,-4.1) 248(21.75,4.1) 249(22,-4.1) 250(22.25,4.1) 251(22.5,-4.1) 252(22.75,4.1) 253(23,-4.1) 254(23.25,4.1) 255(23.5,-4.1) 256(23.75,4.1) 257(24,-4.1) 258(24.25,4.1) 259(24.5,-4.1) 260(24.75,4.1) 261(25,-4.1) 262(25.25,4.1) 263(25.5,-4.1) 264(25.75,4.1) 265(26,-4.1) 266(26.25,4.1) 267(26.5,-4.1) 268(26.75,4.1) 269(27,-4.1) 270(27.25,4.1) 271(27.5,-4.1) 272(27.75,4.1) 273(28,-4.1) 274(28.25,4.1) 275(28.5,-4.1) 276(28.75,4.1) 277(29,-4.1) 278(29.25,4.1) 279(29.5,-4.1) 280(29.75,4.1) 281(30,-4.1) 282(30.25,4.1) 283(30.5,-4.1) 284(30.75,4.1) 285(31,-4.1) 286(31.25,4.1) 287(31.5,-4.1) 288(31.75,4.1) 289(32,-4.1) 290(32.25,4.1) 291(32.5,-4.1) 292(32.75,4.1) 293(33,-4.1) 294(33.25,4.1) 295(33.5,-4.1) 296(33.75,4.1) 297(34,-4.1) 298(34.25,4.1) 299(34.5,-4.1) 300(34.75,4.1) 301(35,-4.1) 302(35.25,4.1) 303(35.5,-4.1) 304(35.75,4.1) 305(36,-4.1) 306(36.25,4.1) 307(36.5,-4.1) 308(36.75,4.1) 309(37,-4.1) 310(37.25,4.1) 311(37.5,-4.1) 312(37.75,4.1) 313(38,-4.1) 314(38.25,4.1) 315(38.5,-4.1) 316(38.75,4.1) 317(39,-4.1) 318(39.25,4.1) 319(39.5,-4.1) 320(39.75,4.1) 321(40,-4.1)
  rect 3.3x5 smd: BE1(-43.95,0) BE2(43.95,0)
  round 1.1 hole 1.1 unplated: ""(-41,1.1)
  round 6.5 hole 4.33: ""(-37.5,-39.9) ""(-37.5,11.1) ""(0,-23.9) ""(37.5,-39.9) ""(37.5,11.1)
  round 1.6 hole 1.6 unplated: ""(41,1.1)
Top Overlay:
  lines w0.2: -46.069,-3 -44.33,-3 -44.33,-7.65 -40.12,-7.65 -40.12,-5.29 40.09,-5.29 40.09,-7.65 44.33,-7.65 44.33,-3 46.069,-3 46.069,3 43.87,3 43.87,5.17 -43.82,5.17 -43.82,3 -46.069,3 -46.069,-3
Mechanical 1:
  lines w0.05: 39.92,-7.82 39.92,-5.46 -39.95,-5.46 -39.95,-7.82 -44.5,-7.82 -44.5,-3.17 -46.24,-3.17 -46.24,3.17 -43.99,3.17 -43.99,5.34 44.04,5.34 44.04,3.16 46.24,3.16 46.24,-3.17 44.5,-3.17 44.5,-7.82 39.95,-7.82
Mechanical 2:
  lines w0.001: -40.9,-2.65 -41.4,-3.35 -41.4,-7.35 -44,-7.35 -44,-3.35 -43.5,-2.65 ; -40.1,-2.65 -40.1,-4.45 -35.9,-4.45 -35.9,-2.65 ; -34.6,-2.65 -34.6,-4.45 1.1,-4.45 1.1,-2.65 ; 0,0 0,2 ; 2,0 2,2 ; 2.9,-2.65 2.9,-4.45 40.1,-4.45 40.1,-2.65 ; 40.9,-2.65 41.4,-3.35 41.4,-7.35 44,-7.35 44,-3.35 43.5,-2.65 ; -43.5,-2.65 43.5,-2.65 ; -43.5,-2.65 -43.5,-2 -44.95,-2 -44.95,2 -43.5,2 -43.5,4.85 43.5,4.85 43.5,2 44.95,2 44.95,-2 43.5,-2 43.5,-2.65 ; -41,-43.9 41,-43.9 41,1.1 -41,1.1 -41,-43.9
Mechanical 3:
  lines w0.1: -40.9,-2.65 -41.4,-3.35 -41.4,-7.35 -44,-7.35 -44,-3.35 -43.5,-2.65 ; -40.1,-2.65 -40.1,-4.45 -35.9,-4.45 -35.9,-2.65 ; -34.6,-2.65 -34.6,-4.45 1.1,-4.45 1.1,-2.65 ; 2.9,-2.65 2.9,-4.45 40.1,-4.45 40.1,-2.65 ; 40.9,-2.65 41.4,-3.35 41.4,-7.35 44,-7.35 44,-3.35 43.5,-2.65 ; -43.5,-2.65 -43.5,-2 -44.95,-2 -44.95,2 -43.5,2 -43.5,4.85 43.5,4.85 43.5,2 44.95,2 44.95,-2 43.5,-2 43.5,-2.65 ; -43.5,-2.65 43.5,-2.65
3D body: height 5.95, standoff 3.02, extent -41,-43.9 41,1.1
3D body: height 8.02, standoff -1.51, extent -40.269,8.326 -34.731,13.874
3D body: height 8.02, standoff -1.51, extent 34.731,8.326 40.269,13.874
3D body: height 3.02, standoff -1.51, extent -2.769,-26.674 2.769,-21.126
3D body: height 3.02, standoff -1.51, extent 34.731,-42.674 40.269,-37.126
3D body: height 3.02, standoff -1.51, extent -40.269,-42.674 -34.731,-37.126
3D body: height 6.72, standoff -0.98, extent -44.95,-7.35 44.95,4.85
3D body: height 12, standoff 4.2, extent -41,-43.9 41,15.1

## T_JVE_21B22564-40S10B-01G [mm] "Header 2x20"
height 8.6
pads (40):
  rect 1.65x1.65 hole 1.15: 1(0,0)
  round 1.65 hole 1.15: 2(0,2.54) 3(2.54,0) 4(2.54,2.54) 5(5.08,0) 6(5.08,2.54) 7(7.62,0) 8(7.62,2.54) 9(10.16,0) 10(10.16,2.54) 11(12.7,0) 12(12.7,2.54) 13(15.24,0) 14(15.24,2.54) 15(17.78,0) 16(17.78,2.54) 17(20.32,0) 18(20.32,2.54) 19(22.86,0) 20(22.86,2.54) 21(25.4,0) 22(25.4,2.54) 23(27.94,0) 24(27.94,2.54) 25(30.48,0) 26(30.48,2.54) 27(33.02,0) 28(33.02,2.54) 29(35.56,0) 30(35.56,2.54) 31(38.1,0) 32(38.1,2.54) 33(40.64,0) 34(40.64,2.54) 35(43.18,0) 36(43.18,2.54) 37(45.72,0) 38(45.72,2.54) 39(48.26,0) 40(48.26,2.54)
Top Overlay:
  lines w0.2: -1.27,-1.14 49.53,-1.14 49.53,3.68 -1.27,3.68 -1.27,-1.137
  text "1" at -1.941,-0.522 h1.27
  text "2" at -2.364,2.048 h1.27
Mechanical 1:
  circle w0.05: c0,0 r0.35
  lines w0.05: -1.27,-1.14 49.53,-1.14 49.53,3.68 -1.27,3.68 -1.27,-1.137 ; -0.5,0 0.5,0 ; 0,-0.5 0,0.5
Mechanical 2:
  lines w0.001: -1.27,-1.14 -1.27,3.68 49.53,3.68 49.53,-1.14 -1.27,-1.14
Mechanical 3:
  circle w0.1: c48.26,2.54 r0.825
  circle w0.1: c48.26,0 r0.825
  circle w0.1: c45.72,2.54 r0.825
  circle w0.1: c45.72,0 r0.825
  circle w0.1: c43.18,2.54 r0.825
  circle w0.1: c43.18,0 r0.825
  circle w0.1: c40.64,2.54 r0.825
  circle w0.1: c40.64,0 r0.825
  circle w0.1: c38.1,2.54 r0.825
  circle w0.1: c38.1,0 r0.825
  circle w0.1: c35.56,2.54 r0.825
  circle w0.1: c35.56,0 r0.825
  circle w0.1: c33.02,2.54 r0.825
  circle w0.1: c33.02,0 r0.825
  circle w0.1: c30.48,2.54 r0.825
  circle w0.1: c30.48,0 r0.825
  circle w0.1: c27.94,2.54 r0.825
  circle w0.1: c27.94,0 r0.825
  circle w0.1: c25.4,2.54 r0.825
  circle w0.1: c25.4,0 r0.825
  circle w0.1: c22.86,2.54 r0.825
  circle w0.1: c22.86,0 r0.825
  circle w0.1: c20.32,2.54 r0.825
  circle w0.1: c20.32,0 r0.825
  circle w0.1: c17.78,2.54 r0.825
  circle w0.1: c17.78,0 r0.825
  circle w0.1: c15.24,2.54 r0.825
  circle w0.1: c15.24,0 r0.825
  circle w0.1: c12.7,2.54 r0.825
  circle w0.1: c12.7,0 r0.825
  circle w0.1: c10.16,2.54 r0.825
  circle w0.1: c10.16,0 r0.825
  circle w0.1: c7.62,2.54 r0.825
  circle w0.1: c7.62,0 r0.825
  circle w0.1: c5.08,2.54 r0.825
  circle w0.1: c5.08,0 r0.825
  circle w0.1: c2.54,2.54 r0.825
  circle w0.1: c2.54,0 r0.825
  circle w0.1: c0,2.54 r0.825
  lines w0.1: -1.27,-1.14 49.53,-1.14 49.53,3.68 -1.27,3.68 -1.27,-1.137 ; -0.825,-0.825 -0.825,0.825 0.825,0.825 0.825,-0.825
3D body: height 8.4, standoff -2.52, extent -1.27,-1.27 49.53,3.81